# Altium schematic symbol library IC_ADI.SCHLIB: 3169 symbols (part 48 of 181)
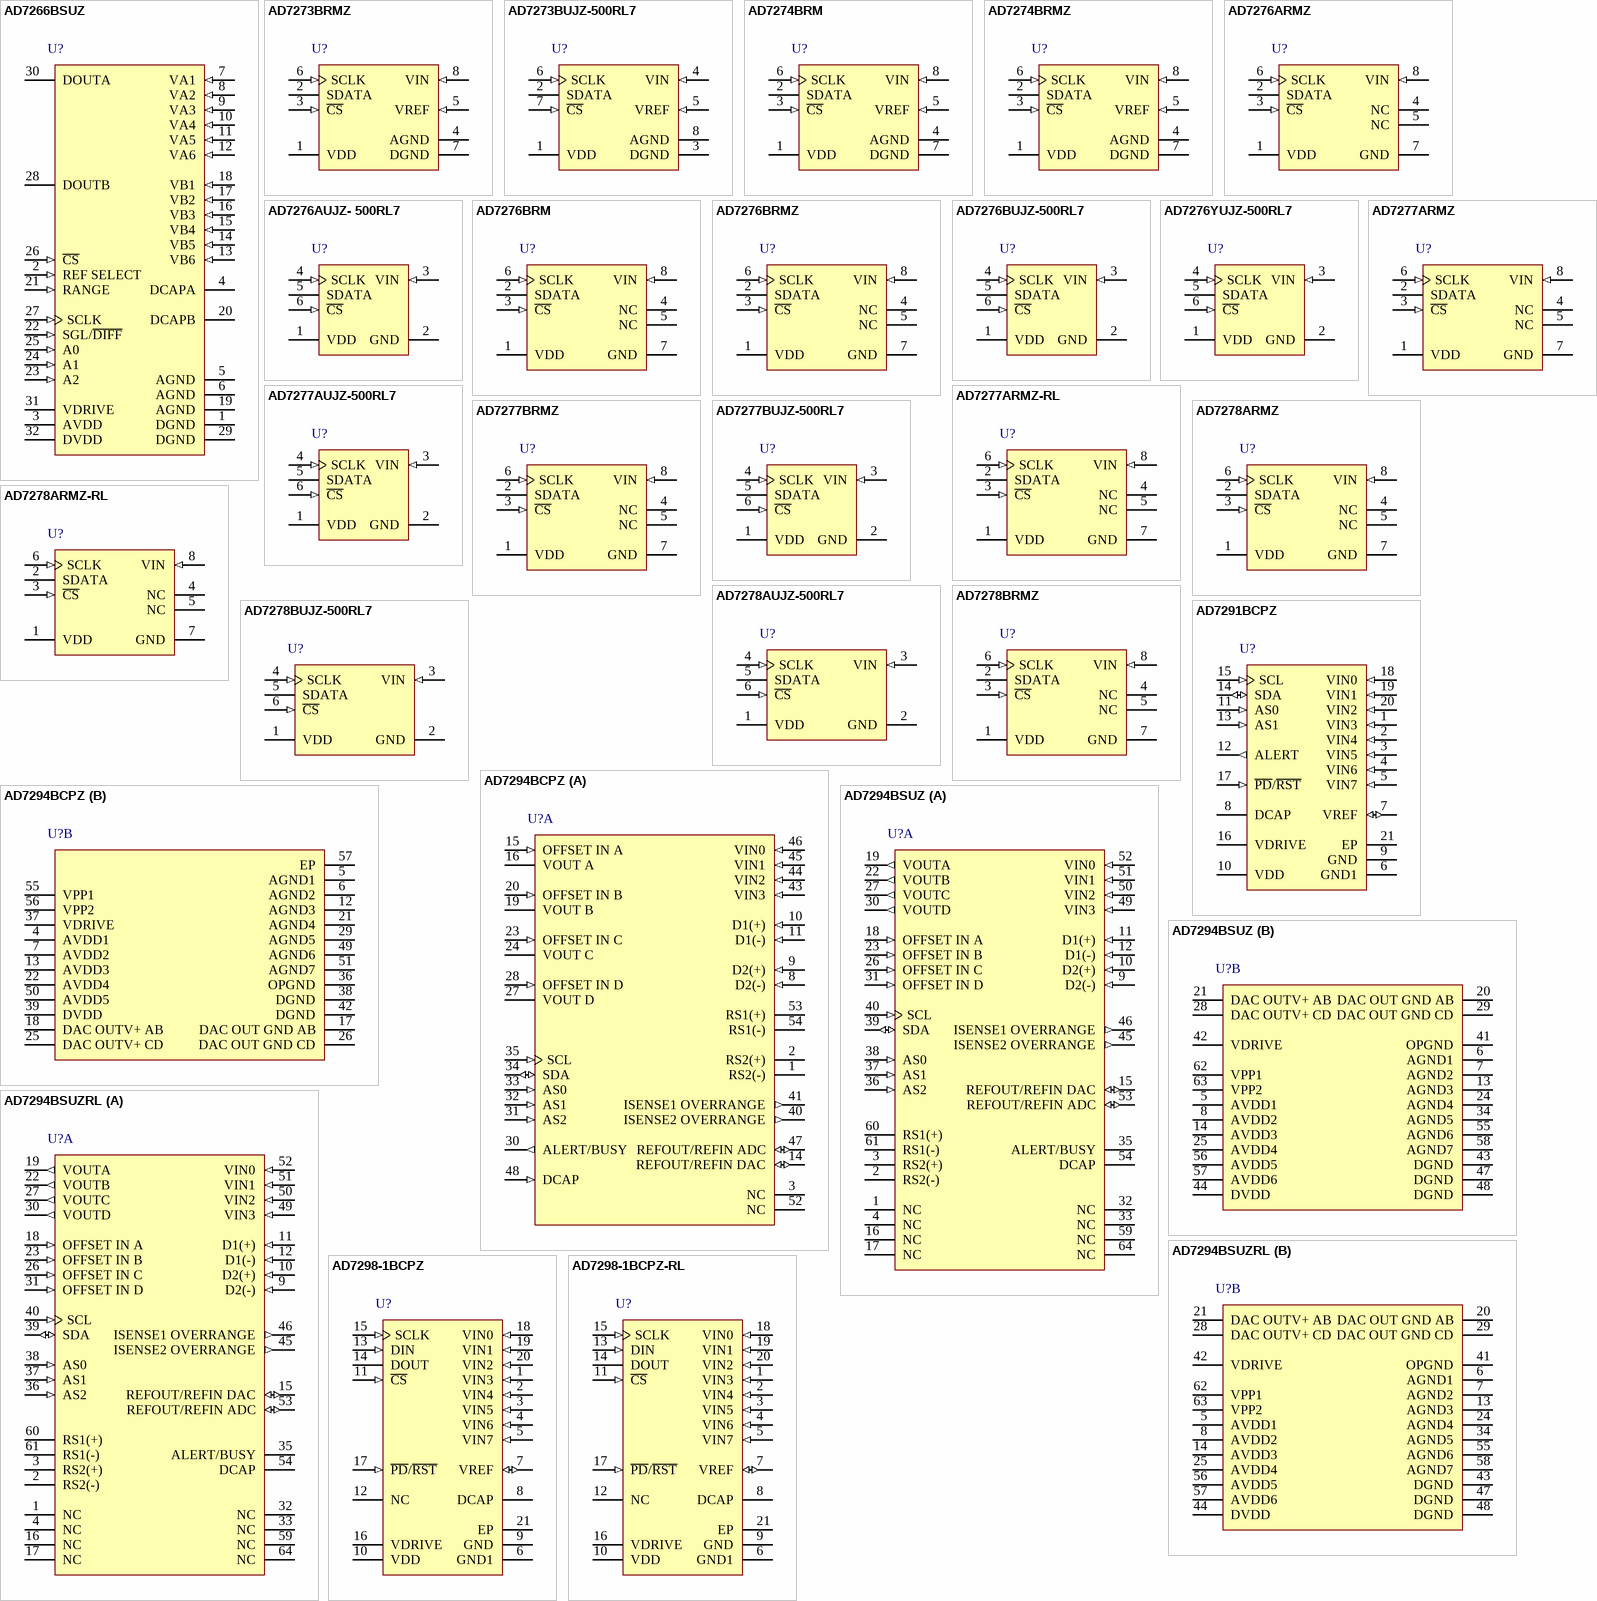
[diagram p238: symbols AD7266BSUZ to AD7298-1BCPZ-RL]

## AD7294BCPZ
designator U?
12-Bit Monitor and Control System with Multichannel ADC, DAC, Temperature Sensor, and Current Sense, 200KSPS, -40 to +105 degC, CP-56-1, Pb-Free, Tray; Generic Part Number: AD7294; PartNumber: AD7294BCPZ; Resolution (Bits): 12; Channels: 9; Throughput Rate (SPS): 200K; Interface: I2C/Ser 2-Wire, Ser; DatasheetVersion: Rev.H; PackageVersion: 112805-0; PackageReference: CP-56-1; PackageDescription: 56-Lead Lead Frame Chip Scale Package [LFCSP_VQ], 8 x 8 mm Body, Very Thin Quad; Supplier Part Number 1: AD7294BCPZ-ND; Supplier Part Number 2: 584-AD7294BCPZ; RoHS: Y; Packing: Tray; Mounting Technology: Surface Mount; Code_JEDEC: MO-220-VLLD-2; ComponentLink1Description: Manufacturer URL; ComponentLink2Description: Datasheet; ComponentLink3Description: Package Specification; ComponentLink4Description: Product URL
footprint QFN56_0.5-PAD(8X8) (Footprint not found)
part A pins: 1 RS2(-) "Connection for External Shunt Resistor", 2 RS2(+) "Connection for External Shunt Resistor", 3 NC "No Connection. Do not connect these pins.", 8 D2(-) (in) "Temperature Sensor Analog Input. These pins are connected to the external temperature sensing transistor. See Figure 46 and Figure 47.", 9 D2(+) (in) "Temperature Sensor Analog Input. These pins are connected to the external temperature sensing transistor. See Figure 46 and Figure 47.", 10 D1(+) (in) "Temperature Sensor Analog Input. These pins are connected to the external temperature sensing transistor. See Figure 46 and Figure 47.", 11 D1(-) (in) "Temperature Sensor Analog Input. These pins are connected to the external temperature sensing transistor. See Figure 46 and Figure 47.", 14 REFOUT/REFIN DAC (io) "DAC Reference Output/Input Pin. The REFOUT/REFIN DAC pin is common to all four DAC channels. On power-up, the default configuration of this pin is external reference (REFIN). Enable the internal reference by writing to the (See Datasheet)", 15 OFFSET IN A (in) "DAC Analog Offset Input Pins. These pins set the desired output range for each DAC channel. The DACs have an output voltage span of 5 V, which can be shifted from 0 V to 5 V to a maximum output voltage of 10 V to 15 V by (See Datasheet)", 16 VOUT A (hiz) "Buffered Analog DAC Outputs for Channel A to Channel D. Each DAC analog output is driven from an output amplifier that can be offset using the OFFSET IN x pin. The DAC has a maximum output voltage span of 5 V that can be (See Datasheet)", 19 VOUT B (hiz) "Buffered Analog DAC Outputs for Channel A to Channel D. Each DAC analog output is driven from an output amplifier that can be offset using the OFFSET IN x pin. The DAC has a maximum output voltage span of 5 V that can be (See Datasheet)", 20 OFFSET IN B (in) "DAC Analog Offset Input Pins. These pins set the desired output range for each DAC channel. The DACs have an output voltage span of 5 V, which can be shifted from 0 V to 5 V to a maximum output voltage of 10 V to 15 V by (See Datasheet)", 23 OFFSET IN C (in) "DAC Analog Offset Input Pins. These pins set the desired output range for each DAC channel. The DACs have an output voltage span of 5 V, which can be shifted from 0 V to 5 V to a maximum output voltage of 10 V to 15 V by (See Datasheet)", 24 VOUT C (hiz) "Buffered Analog DAC Outputs for Channel A to Channel D. Each DAC analog output is driven from an output amplifier that can be offset using the OFFSET IN x pin. The DAC has a maximum output voltage span of 5 V that can be (See Datasheet)", 27 VOUT D (hiz) "Buffered Analog DAC Outputs for Channel A to Channel D. Each DAC analog output is driven from an output amplifier that can be offset using the OFFSET IN x pin. The DAC has a maximum output voltage span of 5 V that can be (See Datasheet)", 28 OFFSET IN D (in) "DAC Analog Offset Input Pins. These pins set the desired output range for each DAC channel. The DACs have an output voltage span of 5 V, which can be shifted from 0 V to 5 V to a maximum output voltage of 10 V to 15 V by (See Datasheet)", 30 ALERT/BUSY (out) "Digital Output. Selectable as an alert or busy output function in the configuration register. This is an open-drain output. An external pull-up resistor is required.When configured as an alert, this pin acts as an (See Datasheet)", 31 AS2 (in) "Digital Logic Input. Together, the logic state of these inputs selects a unique I2C address for the AD7294. See Table 34 for details.", 32 AS1 (in) "Digital Logic Input. Together, the logic state of these inputs selects a unique I2C address for the AD7294. See Table 34 for details.", 33 AS0 (in) "Digital Logic Input. Together, the logic state of these inputs selects a unique I2C address for the AD7294. See Table 34 for details.", 34 SDA (io) "Digital Input/Output. Serial bus bidirectional data; external pull-up resistor required.", 35 SCL (in) "Serial I2C Bus Clock. The data transfer rate in I2C mode is compatible with both 100 kHz and 400 kHz operating modes. Open-drain input; external pull-up resistor required.", 40 ISENSE2 OVERRANGE (out) "Fault Comparator Outputs. These pins connect to the high-side current sense amplifiers.", 41 ISENSE1 OVERRANGE (out) "Fault Comparator Outputs. These pins connect to the high-side current sense amplifiers.", 43 VIN3 (in) "Uncommitted ADC Analog Inputs. These pins are programmable as four single-ended channels or two true differential analog input channel pairs.", 44 VIN2 (in) "Uncommitted ADC Analog Inputs. These pins are programmable as four single-ended channels or two true differential analog input channel pairs.", 45 VIN1 (in) "Uncommitted ADC Analog Inputs. These pins are programmable as four single-ended channels or two true differential analog input channel pairs.", 46 VIN0 (in) "Uncommitted ADC Analog Inputs. These pins are programmable as four single-ended channels or two true differential analog input channel pairs.", 47 REFOUT/REFIN ADC (io) "ADC Reference Input/Output Pin. The REFOUT/REFIN ADC pin provides the reference source for the ADC. Upon power-up, the default configuration of this pin is external reference (REFIN). Enable the internal reference by writing (See Datasheet)", 48 DCAP (in) "External Decoupling Capacitor Input for Internal Temperature Sensor. Decouple this pin to AGND using a 0.1 uF capacitor. In normal operation, the voltage is typically 3.7 V.", 52 NC "No Connection. Do not connect these pins.", 53 RS1(+) "Connection for External Shunt Resistor", 54 RS1(-) "Connection for External Shunt Resistor"
part B pins: 4 AVDD1 (power) "Analog Supply Pins. The operating range is 4.5 V to 5.5 V. These pins provide the supply voltage for all the analog circuitry on the AD7294. Connect the AVDD and DVDD pins together to ensure that all supply pins are at the (See Datasheet)", 5 AGND1 (power) "Analog Ground. Ground reference point for all analog circuitry on the AD7294. Refer all analog input signals and any external reference signal to this AGND voltage. Connect all seven of these AGND pins to the AGND plane of (See Datasheet)", 6 AGND2 (power) "Analog Ground. Ground reference point for all analog circuitry on the AD7294. Refer all analog input signals and any external reference signal to this AGND voltage. Connect all seven of these AGND pins to the AGND plane of (See Datasheet)", 7 AVDD2 (power) "Analog Supply Pins. The operating range is 4.5 V to 5.5 V. These pins provide the supply voltage for all the analog circuitry on the AD7294. Connect the AVDD and DVDD pins together to ensure that all supply pins are at the (See Datasheet)", 12 AGND3 (power) "Analog Ground. Ground reference point for all analog circuitry on the AD7294. Refer all analog input signals and any external reference signal to this AGND voltage. Connect all seven of these AGND pins to the AGND plane of (See Datasheet)", 13 AVDD3 (power) "Analog Supply Pins. The operating range is 4.5 V to 5.5 V. These pins provide the supply voltage for all the analog circuitry on the AD7294. Connect the AVDD and DVDD pins together to ensure that all supply pins are at the (See Datasheet)", 17 DAC OUT GND AB (power) "Analog Ground. Analog ground pins for the DAC output amplifiers on VOUTA and VOUTB, and VOUTC and VOUTD, respectively.", 18 DAC OUTV+ AB (power) "Analog Supply. Analog supply pins for the DAC output amplifiers on VOUTA and VOUTB, and VOUTC and VOUTD, respectively. The operating range is 4.5 V to 16.5 V.", 21 AGND4 (power) "Analog Ground. Ground reference point for all analog circuitry on the AD7294. Refer all analog input signals and any external reference signal to this AGND voltage. Connect all seven of these AGND pins to the AGND plane of (See Datasheet)", 22 AVDD4 (power) "Analog Supply Pins. The operating range is 4.5 V to 5.5 V. These pins provide the supply voltage for all the analog circuitry on the AD7294. Connect the AVDD and DVDD pins together to ensure that all supply pins are at the (See Datasheet)", 25 DAC OUTV+ CD (power) "Analog Supply. Analog supply pins for the DAC output amplifiers on VOUTA and VOUTB, and VOUTC and VOUTD, respectively. The operating range is 4.5 V to 16.5 V.", 26 DAC OUT GND CD (power) "Analog Ground. Analog ground pins for the DAC output amplifiers on VOUTA and VOUTB, and VOUTC and VOUTD, respectively.", 29 AGND5 (power) "Analog Ground. Ground reference point for all analog circuitry on the AD7294. Refer all analog input signals and any external reference signal to this AGND voltage. Connect all seven of these AGND pins to the AGND plane of (See Datasheet)", 36 OPGND (power) "Dedicated Ground Pin for I2C Interface.", 37 VDRIVE (power) "Logic Power Supply. The voltage supplied at this pin determines at what voltage the interface operates. Decouple this pin to DGND. The voltage range on this pin is 2.7 V to 5.5 V and may be different to the voltage level at (See Datasheet)", 38 DGND (power) "Digital Ground. This pin is the ground for all digital circuitry.", 39 DVDD (power) "Logic Power Supply. The operating range is 4.5 V to 5.5 V. These pins provide the supply voltage for all the digital circuitry on the AD7294. Connect the AVDD and DVDD pins together to ensure that all supply pins are at the (See Datasheet)", 42 DGND (power) "Digital Ground. This pin is the ground for all digital circuitry.", 49 AGND6 (power) "Analog Ground. Ground reference point for all analog circuitry on the AD7294. Refer all analog input signals and any external reference signal to this AGND voltage. Connect all seven of these AGND pins to the AGND plane of (See Datasheet)", 50 AVDD5 (power) "Analog Supply Pins. The operating range is 4.5 V to 5.5 V. These pins provide the supply voltage for all the analog circuitry on the AD7294. Connect the AVDD and DVDD pins together to ensure that all supply pins are at the (See Datasheet)", 51 AGND7 (power) "Analog Ground. Ground reference point for all analog circuitry on the AD7294. Refer all analog input signals and any external reference signal to this AGND voltage. Connect all seven of these AGND pins to the AGND plane of (See Datasheet)", 55 VPP1 (power) "Current Sensor Supply Pins. Power supply pins for the high-side current sense amplifiers. Operating range is from AVDD to 59.4 V. Decouple this supply to AGND.", 56 VPP2 (power) "Current Sensor Supply Pins. Power supply pins for the high-side current sense amplifiers. Operating range is from AVDD to 59.4 V. Decouple this supply to AGND.", 57 EP (power) "The exposed pad is located on the underside of the package. Connect the exposed pad to the ground plane of the PCB using multiple vias."

## AD7294BSUZ
designator U?
12-Bit Monitor and Control System with Multichannel ADC, DAC, Temperature Sensor, and Current Sense, 200KSPS, -40 to +105 degC, SU-64-1, Pb-Free, Tray; Generic Part Number: AD7294; PartNumber: AD7294BSUZ; Resolution (Bits): 12; Channels: 9; Throughput Rate (SPS): 200K; Interface: I2C/Ser 2-Wire, Ser; DatasheetVersion: Rev.H; PackageVersion: 032206-A; PackageReference: SU-64-1; PackageDescription: 64-Lead Thin Plastic Quad Flat Package [TQFP]; Supplier Part Number 1: AD7294BSUZ-ND; Supplier Part Number 2: 1607230; Supplier Part Number 3: 84M7804; Supplier Part Number 4: 584-AD7294BSUZ; RoHS: Y; Packing: Tray; Mounting Technology: Surface Mount; Code_JEDEC: MS-026-ABD; ComponentLink1Description: Manufacturer URL; ComponentLink2Description: Datasheet; ComponentLink3Description: Package Specification; ComponentLink4Description: Product URL
footprint LQFP64_0.4MM(10X10) (Footprint not found)
part A pins: 1 NC "No Connection. Do not connect these pins", 2 RS2(-) "Connection for External Shunt Resistor", 3 RS2(+) "Connection for External Shunt Resistor", 4 NC "No Connection. Do not connect these pins", 9 D2(-) (in) "Temperature Sensor Analog Input. These pins are connected to the external temperature sensing transistor. See Figure 46 and Figure 47", 10 D2(+) (in) "Temperature Sensor Analog Input. These pins are connected to the external temperature sensing transistor. See Figure 46 and Figure 47", 11 D1(+) (in) "Temperature Sensor Analog Input. These pins are connected to the external temperature sensing transistor. See Figure 46 and Figure 47", 12 D1(-) (in) "Temperature Sensor Analog Input. These pins are connected to the external temperature sensing transistor. See Figure 46 and Figure 47", 15 REFOUT/REFIN DAC (io) "DAC Reference Output/Input Pin. The REFOUT/REFIN DAC pin is common to all four DAC channels. On power-up, the default configuration of this pin is external reference (REFIN). Enable the internal reference by writing to the (See Datasheet)", 16 NC "No Connection. Do not connect these pins", 17 NC "No Connection. Do not connect these pins", 18 OFFSET IN A (in) "DAC Analog Offset Input Pins. These pins set the desired output range for each DAC channel. The DACs have an output voltage span of 5 V, which can be shifted from 0 V to 5 V to a maximum output voltage of 10 V to 15 V by (See Datasheet)", 19 VOUTA (out) "Buffered Analog DAC Outputs for Channel A to Channel D. Each DAC analog output is driven from an output amplifier that can be offset using the OFFSET IN x pin. The DAC has a maximum output voltage span of 5 V that can be (See Datasheet)", 22 VOUTB (out) "Buffered Analog DAC Outputs for Channel A to Channel D. Each DAC analog output is driven from an output amplifier that can be offset using the OFFSET IN x pin. The DAC has a maximum output voltage span of 5 V that can be (See Datasheet)", 23 OFFSET IN B (in) "DAC Analog Offset Input Pins. These pins set the desired output range for each DAC channel. The DACs have an output voltage span of 5 V, which can be shifted from 0 V to 5 V to a maximum output voltage of 10 V to 15 V by (See Datasheet)", 26 OFFSET IN C (in) "DAC Analog Offset Input Pins. These pins set the desired output range for each DAC channel. The DACs have an output voltage span of 5 V, which can be shifted from 0 V to 5 V to a maximum output voltage of 10 V to 15 V by (See Datasheet)", 27 VOUTC (out) "Buffered Analog DAC Outputs for Channel A to Channel D. Each DAC analog output is driven from an output amplifier that can be offset using the OFFSET IN x pin. The DAC has a maximum output voltage span of 5 V that can be (See Datasheet)", 30 VOUTD (out) "Buffered Analog DAC Outputs for Channel A to Channel D. Each DAC analog output is driven from an output amplifier that can be offset using the OFFSET IN x pin. The DAC has a maximum output voltage span of 5 V that can be (See Datasheet)", 31 OFFSET IN D (in) "DAC Analog Offset Input Pins. These pins set the desired output range for each DAC channel. The DACs have an output voltage span of 5 V, which can be shifted from 0 V to 5 V to a maximum output voltage of 10 V to 15 V by (See Datasheet)", 32 NC "No Connection. Do not connect these pins", 33 NC "No Connection. Do not connect these pins", 35 ALERT/BUSY (oc) "Digital Output. Selectable as an alert or busy output function in the configuration register. This is an open-drain output. An external pull-up resistor is required.When configured as an alert, this pin acts as an (See Datasheet)", 36 AS2 (in) "Digital Logic Input. Together, the logic state of these inputs selects a unique I2C address for the AD7294. See Table 34 for details.", 37 AS1 (in) "Digital Logic Input. Together, the logic state of these inputs selects a unique I2C address for the AD7294. See Table 34 for details.", 38 AS0 (in) "Digital Logic Input. Together, the logic state of these inputs selects a unique I2C address for the AD7294. See Table 34 for details.", 39 SDA (io) "Digital Input/Output. Serial bus bidirectional data; external pull-up resistor required.", 40 SCL (in) "Serial I2C Bus Clock. The data transfer rate in I2C mode is compatible with both 100 kHz and 400 kHz operating modes. Open-drain input; external pull-up resistor required.", 45 ISENSE2 OVERRANGE (out) "Fault Comparator Outputs. These pins connect to the high-side current sense amplifiers", 46 ISENSE1 OVERRANGE (out) "Fault Comparator Outputs. These pins connect to the high-side current sense amplifiers", 49 VIN3 (in) "Uncommitted ADC Analog Inputs. These pins are programmable as four single-ended channels or two true differential analog input channel pairs. See Table 1 and Table 13 for more details", 50 VIN2 (in) "Uncommitted ADC Analog Inputs. These pins are programmable as four single-ended channels or two true differential analog input channel pairs. See Table 1 and Table 13 for more details", 51 VIN1 (in) "Uncommitted ADC Analog Inputs. These pins are programmable as four single-ended channels or two true differential analog input channel pairs. See Table 1 and Table 13 for more details", 52 VIN0 (in) "Uncommitted ADC Analog Inputs. These pins are programmable as four single-ended channels or two true differential analog input channel pairs. See Table 1 and Table 13 for more details", 53 REFOUT/REFIN ADC (io) "ADC Reference Input/Output Pin. The REFOUT/REFIN ADC pin provides the reference source for the ADC. Upon power-up, the default configuration of this pin is external reference (REFIN). Enable the internal reference by writing (See Datasheet)", 54 DCAP "External Decoupling Capacitor Input for Internal Temperature Sensor. Decouple this pin to AGND using a 0.1 uF capacitor. In normal operation, the voltage is typically 3.7 V", 59 NC "No Connection. Do not connect these pins", 60 RS1(+) "Connection for External Shunt Resistor", 61 RS1(-) "Connection for External Shunt Resistor", 64 NC "No Connection. Do not connect these pins"
part B pins: 5 AVDD1 (power) "Analog Supply Pins. The operating range is 4.5 V to 5.5 V. These pins provide the supply voltage for all the analog circuitry on the AD7294. Connect the AVDD and DVDD pins together to ensure that all supply pins are at the (See Datasheet)", 6 AGND1 (power) "Analog Ground. Ground reference point for all analog circuitry on the AD7294. Refer all analog input signals and any external reference signal to this AGND voltage. Connect all seven of these AGND pins to the AGND plane of (See Datasheet)", 7 AGND2 (power) "Analog Ground. Ground reference point for all analog circuitry on the AD7294. Refer all analog input signals and any external reference signal to this AGND voltage. Connect all seven of these AGND pins to the AGND plane of (See Datasheet)", 8 AVDD2 (power) "Analog Supply Pins. The operating range is 4.5 V to 5.5 V. These pins provide the supply voltage for all the analog circuitry on the AD7294. Connect the AVDD and DVDD pins together to ensure that all supply pins are at the (See Datasheet)", 13 AGND3 (power) "Analog Ground. Ground reference point for all analog circuitry on the AD7294. Refer all analog input signals and any external reference signal to this AGND voltage. Connect all seven of these AGND pins to the AGND plane of (See Datasheet)", 14 AVDD3 (power) "Analog Supply Pins. The operating range is 4.5 V to 5.5 V. These pins provide the supply voltage for all the analog circuitry on the AD7294. Connect the AVDD and DVDD pins together to ensure that all supply pins are at the (See Datasheet)", 20 DAC OUT GND AB (power) "Analog Ground. Analog ground pins for the DAC output amplifiers on VOUTA and VOUTB, and VOUTC and VOUTD, respectively", 21 DAC OUTV+ AB (power) "Analog Supply. Analog supply pins for the DAC output amplifiers on VOUTA and VOUTB, and VOUTC and VOUTD, respectively. The operating range is 4.5 V to 16.5 V", 24 AGND4 (power) "Analog Ground. Ground reference point for all analog circuitry on the AD7294. Refer all analog input signals and any external reference signal to this AGND voltage. Connect all seven of these AGND pins to the AGND plane of (See Datasheet)", 25 AVDD4 (power) "Analog Supply Pins. The operating range is 4.5 V to 5.5 V. These pins provide the supply voltage for all the analog circuitry on the AD7294. Connect the AVDD and DVDD pins together to ensure that all supply pins are at the (See Datasheet)", 28 DAC OUTV+ CD (power) "Analog Supply. Analog supply pins for the DAC output amplifiers on VOUTA and VOUTB, and VOUTC and VOUTD, respectively. The operating range is 4.5 V to 16.5 V", 29 DAC OUT GND CD (power) "Analog Ground. Analog ground pins for the DAC output amplifiers on VOUTA and VOUTB, and VOUTC and VOUTD, respectively", 34 AGND5 (power) "Analog Ground. Ground reference point for all analog circuitry on the AD7294. Refer all analog input signals and any external reference signal to this AGND voltage. Connect all seven of these AGND pins to the AGND plane of (See Datasheet)", 41 OPGND (power) "Dedicated Ground Pin for I2C Interface", 42 VDRIVE (power) "Logic Power Supply. The voltage supplied at this pin determines at what voltage the interface operates. Decouple this pin to DGND. The voltage range on this pin is 2.7 V to 5.5 V and may be different to the voltage level at (See Datasheet)", 43 DGND (power) "Digital Ground. This pin is the ground for all digital circuitry", 44 DVDD (power) "Logic Power Supply. The operating range is 4.5 V to 5.5 V. These pins provide the supply voltage for all the digital circuitry on the AD7294. Connect the AVDD and DVDD pins together to ensure that all supply pins are at the (See Datasheet)", 47 DGND (power) "Digital Ground. This pin is the ground for all digital circuitry", 48 DGND (power) "Digital Ground. This pin is the ground for all digital circuitry", 55 AGND6 (power) "Analog Ground. Ground reference point for all analog circuitry on the AD7294. Refer all analog input signals and any external reference signal to this AGND voltage. Connect all seven of these AGND pins to the AGND plane of (See Datasheet)", 56 AVDD5 (power) "Analog Supply Pins. The operating range is 4.5 V to 5.5 V. These pins provide the supply voltage for all the analog circuitry on the AD7294. Connect the AVDD and DVDD pins together to ensure that all supply pins are at the (See Datasheet)", 57 AVDD6 (power) "Analog Supply Pins. The operating range is 4.5 V to 5.5 V. These pins provide the supply voltage for all the analog circuitry on the AD7294. Connect the AVDD and DVDD pins together to ensure that all supply pins are at the (See Datasheet)", 58 AGND7 (power) "Analog Ground. Ground reference point for all analog circuitry on the AD7294. Refer all analog input signals and any external reference signal to this AGND voltage. Connect all seven of these AGND pins to the AGND plane of (See Datasheet)", 62 VPP1 (power) "Current Sensor Supply Pins. Power supply pins for the high-side current sense amplifiers. Operating range is from AVDD to 59.4 V. Decouple this supply to AGND. See the Current Sense Filtering section", 63 VPP2 (power) "Current Sensor Supply Pins. Power supply pins for the high-side current sense amplifiers. Operating range is from AVDD to 59.4 V. Decouple this supply to AGND. See the Current Sense Filtering section"

## AD7294BSUZRL
designator U?
12-Bit Monitor and Control System with Multichannel ADC, DAC, Temperature Sensor, and Current Sense, 200KSPS, -40 to +105 degC, SU-64-1, Pb-Free, Reel; Generic Part Number: AD7294; PartNumber: AD7294BSUZRL; Resolution (Bits): 12; Channels: 9; Throughput Rate (SPS): 200K; Interface: I2C/Ser 2-Wire, Ser; DatasheetVersion: Rev.H; PackageVersion: 032206-A; PackageReference: SU-64-1; PackageDescription: 64-Lead Thin Plastic Quad Flat Package [TQFP]; Supplier Part Number 1: AD7294BSUZRL-ND; Supplier Part Number 2: 584-AD7294BSUZR; RoHS: Y; Packing: Reel; Mounting Technology: Surface Mount; Code_JEDEC: MS-026-ABD; ComponentLink1Description: Manufacturer URL; ComponentLink2Description: Datasheet; ComponentLink3Description: Package Specification; ComponentLink4Description: Product URL
footprint LQFP64_0.4MM(10X10) (Footprint not found)
part A pins: 1 NC "No Connection. Do not connect these pins", 2 RS2(-) "Connection for External Shunt Resistor", 3 RS2(+) "Connection for External Shunt Resistor", 4 NC "No Connection. Do not connect these pins", 9 D2(-) (in) "Temperature Sensor Analog Input. These pins are connected to the external temperature sensing transistor. See Figure 46 and Figure 47", 10 D2(+) (in) "Temperature Sensor Analog Input. These pins are connected to the external temperature sensing transistor. See Figure 46 and Figure 47", 11 D1(+) (in) "Temperature Sensor Analog Input. These pins are connected to the external temperature sensing transistor. See Figure 46 and Figure 47", 12 D1(-) (in) "Temperature Sensor Analog Input. These pins are connected to the external temperature sensing transistor. See Figure 46 and Figure 47", 15 REFOUT/REFIN DAC (io) "DAC Reference Output/Input Pin. The REFOUT/REFIN DAC pin is common to all four DAC channels. On power-up, the default configuration of this pin is external reference (REFIN). Enable the internal reference by writing to the (See Datasheet)", 16 NC "No Connection. Do not connect these pins", 17 NC "No Connection. Do not connect these pins", 18 OFFSET IN A (in) "DAC Analog Offset Input Pins. These pins set the desired output range for each DAC channel. The DACs have an output voltage span of 5 V, which can be shifted from 0 V to 5 V to a maximum output voltage of 10 V to 15 V by (See Datasheet)", 19 VOUTA (out) "Buffered Analog DAC Outputs for Channel A to Channel D. Each DAC analog output is driven from an output amplifier that can be offset using the OFFSET IN x pin. The DAC has a maximum output voltage span of 5 V that can be (See Datasheet)", 22 VOUTB (out) "Buffered Analog DAC Outputs for Channel A to Channel D. Each DAC analog output is driven from an output amplifier that can be offset using the OFFSET IN x pin. The DAC has a maximum output voltage span of 5 V that can be (See Datasheet)", 23 OFFSET IN B (in) "DAC Analog Offset Input Pins. These pins set the desired output range for each DAC channel. The DACs have an output voltage span of 5 V, which can be shifted from 0 V to 5 V to a maximum output voltage of 10 V to 15 V by (See Datasheet)", 26 OFFSET IN C (in) "DAC Analog Offset Input Pins. These pins set the desired output range for each DAC channel. The DACs have an output voltage span of 5 V, which can be shifted from 0 V to 5 V to a maximum output voltage of 10 V to 15 V by (See Datasheet)", 27 VOUTC (out) "Buffered Analog DAC Outputs for Channel A to Channel D. Each DAC analog output is driven from an output amplifier that can be offset using the OFFSET IN x pin. The DAC has a maximum output voltage span of 5 V that can be (See Datasheet)", 30 VOUTD (out) "Buffered Analog DAC Outputs for Channel A to Channel D. Each DAC analog output is driven from an output amplifier that can be offset using the OFFSET IN x pin. The DAC has a maximum output voltage span of 5 V that can be (See Datasheet)", 31 OFFSET IN D (in) "DAC Analog Offset Input Pins. These pins set the desired output range for each DAC channel. The DACs have an output voltage span of 5 V, which can be shifted from 0 V to 5 V to a maximum output voltage of 10 V to 15 V by (See Datasheet)", 32 NC "No Connection. Do not connect these pins", 33 NC "No Connection. Do not connect these pins", 35 ALERT/BUSY (oc) "Digital Output. Selectable as an alert or busy output function in the configuration register. This is an open-drain output. An external pull-up resistor is required.When configured as an alert, this pin acts as an (See Datasheet)", 36 AS2 (in) "Digital Logic Input. Together, the logic state of these inputs selects a unique I2C address for the AD7294. See Table 34 for details.", 37 AS1 (in) "Digital Logic Input. Together, the logic state of these inputs selects a unique I2C address for the AD7294. See Table 34 for details.", 38 AS0 (in) "Digital Logic Input. Together, the logic state of these inputs selects a unique I2C address for the AD7294. See Table 34 for details.", 39 SDA (io) "Digital Input/Output. Serial bus bidirectional data; external pull-up resistor required.", 40 SCL (in) "Serial I2C Bus Clock. The data transfer rate in I2C mode is compatible with both 100 kHz and 400 kHz operating modes. Open-drain input; external pull-up resistor required.", 45 ISENSE2 OVERRANGE (out) "Fault Comparator Outputs. These pins connect to the high-side current sense amplifiers", 46 ISENSE1 OVERRANGE (out) "Fault Comparator Outputs. These pins connect to the high-side current sense amplifiers", 49 VIN3 (in) "Uncommitted ADC Analog Inputs. These pins are programmable as four single-ended channels or two true differential analog input channel pairs. See Table 1 and Table 13 for more details", 50 VIN2 (in) "Uncommitted ADC Analog Inputs. These pins are programmable as four single-ended channels or two true differential analog input channel pairs. See Table 1 and Table 13 for more details", 51 VIN1 (in) "Uncommitted ADC Analog Inputs. These pins are programmable as four single-ended channels or two true differential analog input channel pairs. See Table 1 and Table 13 for more details", 52 VIN0 (in) "Uncommitted ADC Analog Inputs. These pins are programmable as four single-ended channels or two true differential analog input channel pairs. See Table 1 and Table 13 for more details", 53 REFOUT/REFIN ADC (io) "ADC Reference Input/Output Pin. The REFOUT/REFIN ADC pin provides the reference source for the ADC. Upon power-up, the default configuration of this pin is external reference (REFIN). Enable the internal reference by writing (See Datasheet)", 54 DCAP "External Decoupling Capacitor Input for Internal Temperature Sensor. Decouple this pin to AGND using a 0.1 uF capacitor. In normal operation, the voltage is typically 3.7 V", 59 NC "No Connection. Do not connect these pins", 60 RS1(+) "Connection for External Shunt Resistor", 61 RS1(-) "Connection for External Shunt Resistor", 64 NC "No Connection. Do not connect these pins"
part B pins: 5 AVDD1 (power) "Analog Supply Pins. The operating range is 4.5 V to 5.5 V. These pins provide the supply voltage for all the analog circuitry on the AD7294. Connect the AVDD and DVDD pins together to ensure that all supply pins are at the (See Datasheet)", 6 AGND1 (power) "Analog Ground. Ground reference point for all analog circuitry on the AD7294. Refer all analog input signals and any external reference signal to this AGND voltage. Connect all seven of these AGND pins to the AGND plane of (See Datasheet)", 7 AGND2 (power) "Analog Ground. Ground reference point for all analog circuitry on the AD7294. Refer all analog input signals and any external reference signal to this AGND voltage. Connect all seven of these AGND pins to the AGND plane of (See Datasheet)", 8 AVDD2 (power) "Analog Supply Pins. The operating range is 4.5 V to 5.5 V. These pins provide the supply voltage for all the analog circuitry on the AD7294. Connect the AVDD and DVDD pins together to ensure that all supply pins are at the (See Datasheet)", 13 AGND3 (power) "Analog Ground. Ground reference point for all analog circuitry on the AD7294. Refer all analog input signals and any external reference signal to this AGND voltage. Connect all seven of these AGND pins to the AGND plane of (See Datasheet)", 14 AVDD3 (power) "Analog Supply Pins. The operating range is 4.5 V to 5.5 V. These pins provide the supply voltage for all the analog circuitry on the AD7294. Connect the AVDD and DVDD pins together to ensure that all supply pins are at the (See Datasheet)", 20 DAC OUT GND AB (power) "Analog Ground. Analog ground pins for the DAC output amplifiers on VOUTA and VOUTB, and VOUTC and VOUTD, respectively", 21 DAC OUTV+ AB (power) "Analog Supply. Analog supply pins for the DAC output amplifiers on VOUTA and VOUTB, and VOUTC and VOUTD, respectively. The operating range is 4.5 V to 16.5 V", 24 AGND4 (power) "Analog Ground. Ground reference point for all analog circuitry on the AD7294. Refer all analog input signals and any external reference signal to this AGND voltage. Connect all seven of these AGND pins to the AGND plane of (See Datasheet)", 25 AVDD4 (power) "Analog Supply Pins. The operating range is 4.5 V to 5.5 V. These pins provide the supply voltage for all the analog circuitry on the AD7294. Connect the AVDD and DVDD pins together to ensure that all supply pins are at the (See Datasheet)", 28 DAC OUTV+ CD (power) "Analog Supply. Analog supply pins for the DAC output amplifiers on VOUTA and VOUTB, and VOUTC and VOUTD, respectively. The operating range is 4.5 V to 16.5 V", 29 DAC OUT GND CD (power) "Analog Ground. Analog ground pins for the DAC output amplifiers on VOUTA and VOUTB, and VOUTC and VOUTD, respectively", 34 AGND5 (power) "Analog Ground. Ground reference point for all analog circuitry on the AD7294. Refer all analog input signals and any external reference signal to this AGND voltage. Connect all seven of these AGND pins to the AGND plane of (See Datasheet)", 41 OPGND (power) "Dedicated Ground Pin for I2C Interface", 42 VDRIVE (power) "Logic Power Supply. The voltage supplied at this pin determines at what voltage the interface operates. Decouple this pin to DGND. The voltage range on this pin is 2.7 V to 5.5 V and may be different to the voltage level at (See Datasheet)", 43 DGND (power) "Digital Ground. This pin is the ground for all digital circuitry", 44 DVDD (power) "Logic Power Supply. The operating range is 4.5 V to 5.5 V. These pins provide the supply voltage for all the digital circuitry on the AD7294. Connect the AVDD and DVDD pins together to ensure that all supply pins are at the (See Datasheet)", 47 DGND (power) "Digital Ground. This pin is the ground for all digital circuitry", 48 DGND (power) "Digital Ground. This pin is the ground for all digital circuitry", 55 AGND6 (power) "Analog Ground. Ground reference point for all analog circuitry on the AD7294. Refer all analog input signals and any external reference signal to this AGND voltage. Connect all seven of these AGND pins to the AGND plane of (See Datasheet)", 56 AVDD5 (power) "Analog Supply Pins. The operating range is 4.5 V to 5.5 V. These pins provide the supply voltage for all the analog circuitry on the AD7294. Connect the AVDD and DVDD pins together to ensure that all supply pins are at the (See Datasheet)", 57 AVDD6 (power) "Analog Supply Pins. The operating range is 4.5 V to 5.5 V. These pins provide the supply voltage for all the analog circuitry on the AD7294. Connect the AVDD and DVDD pins together to ensure that all supply pins are at the (See Datasheet)", 58 AGND7 (power) "Analog Ground. Ground reference point for all analog circuitry on the AD7294. Refer all analog input signals and any external reference signal to this AGND voltage. Connect all seven of these AGND pins to the AGND plane of (See Datasheet)", 62 VPP1 (power) "Current Sensor Supply Pins. Power supply pins for the high-side current sense amplifiers. Operating range is from AVDD to 59.4 V. Decouple this supply to AGND. See the Current Sense Filtering section", 63 VPP2 (power) "Current Sensor Supply Pins. Power supply pins for the high-side current sense amplifiers. Operating range is from AVDD to 59.4 V. Decouple this supply to AGND. See the Current Sense Filtering section"

## AD7298-1BCPZ
designator U?
8 Channel 10-Bit SAR Analog-to-Digital Converter with SPI Interface, 1MSPS, -40 to +125 degC, CP-20-8, Pb-Free, Tray; Generic Part Number: AD7298-1; PartNumber: AD7298-1BCPZ; Resolution (Bits): 10; Channels: 8; Throughput Rate (SPS): 1M; DatasheetVersion: Rev.A; PackageVersion: 020509-B; PackageReference: CP-20-8; PackageDescription: 20-Lead Lead Frame Chip Scale Package [LFCSP_WQ] 4 x 4 mm Body, Very Very Thin Quad; Supplier Part Number 1: AD7298-1BCPZ-ND; Supplier Part Number 2: 1864665; Supplier Part Number 3: 27T5722; Supplier Part Number 4: 18T2145; Supplier Part Number 5: 584-AD7298-1BCPZ; Interface: SPI; RoHS: Y; Packing: Tray; Mounting Technology: Surface Mount; Code_JEDEC: MO-220-WGGD; ComponentLink1Description: Manufacturer URL; ComponentLink2Description: Datasheet; ComponentLink3Description: Package Specification; ComponentLink4Description: Product URL
footprint QFN20_0.5-PAD(4X4) (Footprint not found)
pins: 1 VIN3 (in) "Analog Inputs. The AD7298-1 has eight single-ended analog inputs that are multiplexed into the on-chip track-and-hold. Each input channel can accept analog inputs from 0 V to 2.5 V. Any unused input channels should be (See Datasheet)", 2 VIN4 (in) "Analog Inputs. The AD7298-1 has eight single-ended analog inputs that are multiplexed into the on-chip track-and-hold. Each input channel can accept analog inputs from 0 V to 2.5 V. Any unused input channels should be (See Datasheet)", 3 VIN5 (in) "Analog Inputs. The AD7298-1 has eight single-ended analog inputs that are multiplexed into the on-chip track-and-hold. Each input channel can accept analog inputs from 0 V to 2.5 V. Any unused input channels should be (See Datasheet)", 4 VIN6 (in) "Analog Inputs. The AD7298-1 has eight single-ended analog inputs that are multiplexed into the on-chip track-and-hold. Each input channel can accept analog inputs from 0 V to 2.5 V. Any unused input channels should be (See Datasheet)", 5 VIN7 (in) "Analog Inputs. The AD7298-1 has eight single-ended analog inputs that are multiplexed into the on-chip track-and-hold. Each input channel can accept analog inputs from 0 V to 2.5 V. Any unused input channels should be (See Datasheet)", 6 GND1 (power) "Ground. Ground reference point for the internal reference circuitry on the AD7298-1. The external reference signals and all analog input signals should be referred to the GND1 voltage. The GND1 pin should be connected to the (See Datasheet)", 7 VREF (io) "Internal Reference/External Reference Supply. The nominal internal reference voltage of 2.5 V appears at this pin.Provided the output is buffered, the on-chip reference can be taken from this pin and applied externally to (See Datasheet)", 8 DCAP "Decoupling Capacitor Pins. Decoupling capacitors (1 uF recommended) are connected to this pin to decouple the internal LDO.", 9 GND (power) "Ground. Ground reference point for all analog and digital circuitry on the AD7298-1. The GND pin should be connected to the ground plane of the system. All ground pins should ideally be at the same potential and must not be (See Datasheet)", 10 VDD (power) "Supply Voltage, 2.8 V to 3.6 V. This supply should be decoupled to GND with 10 uF and 100 nF decoupling capacitors.", 11 ~{CS} (in) "Chip Select, Active Low Logic Input. This pin is edge triggered on the falling edge of this input, the track-and-hold goes into hold mode, and a conversion is initiated. This input also frames the serial data transfer. When (See Datasheet)", 12 NC "No Connect.", 13 DIN (in) "Data In, Logic Input. Data to be written to the AD7298-1 control register is provided on this input and is clocked into the register on the falling edge of SCLK.", 14 DOUT (hiz) "Serial Data Output. The conversion result from the AD7298-1 is provided on this output as a serial data stream.The bits are clocked out on the falling edge of the SCLK input. The data stream from the AD7298-1 consists of (See Datasheet)", 15 SCLK (in) "Serial Clock, Logic Input. A serial clock input provides the SCLK for accessing the data from the AD7298-1.", 16 VDRIVE (power) "Logic Power Supply Input. The voltage supplied at this pin determines the voltage at which the interface operates. This pin should be decoupled to ground. The voltage range on this pin is 1.65 V to 3.6 V and may be less than (See Datasheet)", 17 ~{PD}/~{RST} (in) "Power-Down Pin. This pin places the part into full power-down mode and enables power conservation when operation is not required. This pin can be used to reset the device by toggling the pin low for a minimum of 1 ns and a (See Datasheet)", 18 VIN0 (in) "Analog Inputs. The AD7298-1 has eight single-ended analog inputs that are multiplexed into the on-chip track-and-hold. Each input channel can accept analog inputs from 0 V to 2.5 V. Any unused input channels should be (See Datasheet)", 19 VIN1 (in) "Analog Inputs. The AD7298-1 has eight single-ended analog inputs that are multiplexed into the on-chip track-and-hold. Each input channel can accept analog inputs from 0 V to 2.5 V. Any unused input channels should be (See Datasheet)", 20 VIN2 (in) "Analog Inputs. The AD7298-1 has eight single-ended analog inputs that are multiplexed into the on-chip track-and-hold. Each input channel can accept analog inputs from 0 V to 2.5 V. Any unused input channels should be (See Datasheet)", 21 EP (power) "The exposed metal paddle on the bottom of the LFCSP package should be soldered to PCB ground for proper functionality and heat dissipation."

## AD7298-1BCPZ-RL
designator U?
8 Channel 10-Bit SAR Analog-to-Digital Converter with SPI Interface, 1MSPS, -40 to +125 degC, CP-20-8, Pb-Free, Reel; Generic Part Number: AD7298-1; PartNumber: AD7298-1BCPZ-RL; Resolution (Bits): 10; Channels: 8; Throughput Rate (SPS): 1M; DatasheetVersion: Rev.A; PackageVersion: 020509-B; PackageReference: CP-20-8; PackageDescription: 20-Lead Lead Frame Chip Scale Package [LFCSP_WQ] 4 x 4 mm Body, Very Very Thin Quad; Supplier Part Number 1: AD7298-1BCPZ-RLTR-ND; Supplier Part Number 2: AD7298-1BCPZ-RLCT-ND; Supplier Part Number 3: AD7298-1BCPZ-RLDKR-ND; Supplier Part Number 4: 584-AD7298-1BCPZ-R; Interface: SPI; RoHS: Y; Packing: Reel; Mounting Technology: Surface Mount; Code_JEDEC: MO-220-WGGD; ComponentLink1Description: Manufacturer URL; ComponentLink2Description: Datasheet; ComponentLink3Description: Package Specification; ComponentLink4Description: Product URL
footprint QFN20_0.5-PAD(4X4) (Footprint not found)
pins: 1 VIN3 (in) "Analog Inputs. The AD7298-1 has eight single-ended analog inputs that are multiplexed into the on-chip track-and-hold. Each input channel can accept analog inputs from 0 V to 2.5 V. Any unused input channels should be (See Datasheet)", 2 VIN4 (in) "Analog Inputs. The AD7298-1 has eight single-ended analog inputs that are multiplexed into the on-chip track-and-hold. Each input channel can accept analog inputs from 0 V to 2.5 V. Any unused input channels should be (See Datasheet)", 3 VIN5 (in) "Analog Inputs. The AD7298-1 has eight single-ended analog inputs that are multiplexed into the on-chip track-and-hold. Each input channel can accept analog inputs from 0 V to 2.5 V. Any unused input channels should be (See Datasheet)", 4 VIN6 (in) "Analog Inputs. The AD7298-1 has eight single-ended analog inputs that are multiplexed into the on-chip track-and-hold. Each input channel can accept analog inputs from 0 V to 2.5 V. Any unused input channels should be (See Datasheet)", 5 VIN7 (in) "Analog Inputs. The AD7298-1 has eight single-ended analog inputs that are multiplexed into the on-chip track-and-hold. Each input channel can accept analog inputs from 0 V to 2.5 V. Any unused input channels should be (See Datasheet)", 6 GND1 (power) "Ground. Ground reference point for the internal reference circuitry on the AD7298-1. The external reference signals and all analog input signals should be referred to the GND1 voltage. The GND1 pin should be connected to the (See Datasheet)", 7 VREF (io) "Internal Reference/External Reference Supply. The nominal internal reference voltage of 2.5 V appears at this pin.Provided the output is buffered, the on-chip reference can be taken from this pin and applied externally to (See Datasheet)", 8 DCAP "Decoupling Capacitor Pins. Decoupling capacitors (1 uF recommended) are connected to this pin to decouple the internal LDO.", 9 GND (power) "Ground. Ground reference point for all analog and digital circuitry on the AD7298-1. The GND pin should be connected to the ground plane of the system. All ground pins should ideally be at the same potential and must not be (See Datasheet)", 10 VDD (power) "Supply Voltage, 2.8 V to 3.6 V. This supply should be decoupled to GND with 10 uF and 100 nF decoupling capacitors.", 11 ~{CS} (in) "Chip Select, Active Low Logic Input. This pin is edge triggered on the falling edge of this input, the track-and-hold goes into hold mode, and a conversion is initiated. This input also frames the serial data transfer. When (See Datasheet)", 12 NC "No Connect.", 13 DIN (in) "Data In, Logic Input. Data to be written to the AD7298-1 control register is provided on this input and is clocked into the register on the falling edge of SCLK.", 14 DOUT (hiz) "Serial Data Output. The conversion result from the AD7298-1 is provided on this output as a serial data stream.The bits are clocked out on the falling edge of the SCLK input. The data stream from the AD7298-1 consists of (See Datasheet)", 15 SCLK (in) "Serial Clock, Logic Input. A serial clock input provides the SCLK for accessing the data from the AD7298-1.", 16 VDRIVE (power) "Logic Power Supply Input. The voltage supplied at this pin determines the voltage at which the interface operates. This pin should be decoupled to ground. The voltage range on this pin is 1.65 V to 3.6 V and may be less than (See Datasheet)", 17 ~{PD}/~{RST} (in) "Power-Down Pin. This pin places the part into full power-down mode and enables power conservation when operation is not required. This pin can be used to reset the device by toggling the pin low for a minimum of 1 ns and a (See Datasheet)", 18 VIN0 (in) "Analog Inputs. The AD7298-1 has eight single-ended analog inputs that are multiplexed into the on-chip track-and-hold. Each input channel can accept analog inputs from 0 V to 2.5 V. Any unused input channels should be (See Datasheet)", 19 VIN1 (in) "Analog Inputs. The AD7298-1 has eight single-ended analog inputs that are multiplexed into the on-chip track-and-hold. Each input channel can accept analog inputs from 0 V to 2.5 V. Any unused input channels should be (See Datasheet)", 20 VIN2 (in) "Analog Inputs. The AD7298-1 has eight single-ended analog inputs that are multiplexed into the on-chip track-and-hold. Each input channel can accept analog inputs from 0 V to 2.5 V. Any unused input channels should be (See Datasheet)", 21 EP (power) "The exposed metal paddle on the bottom of the LFCSP package should be soldered to PCB ground for proper functionality and heat dissipation."

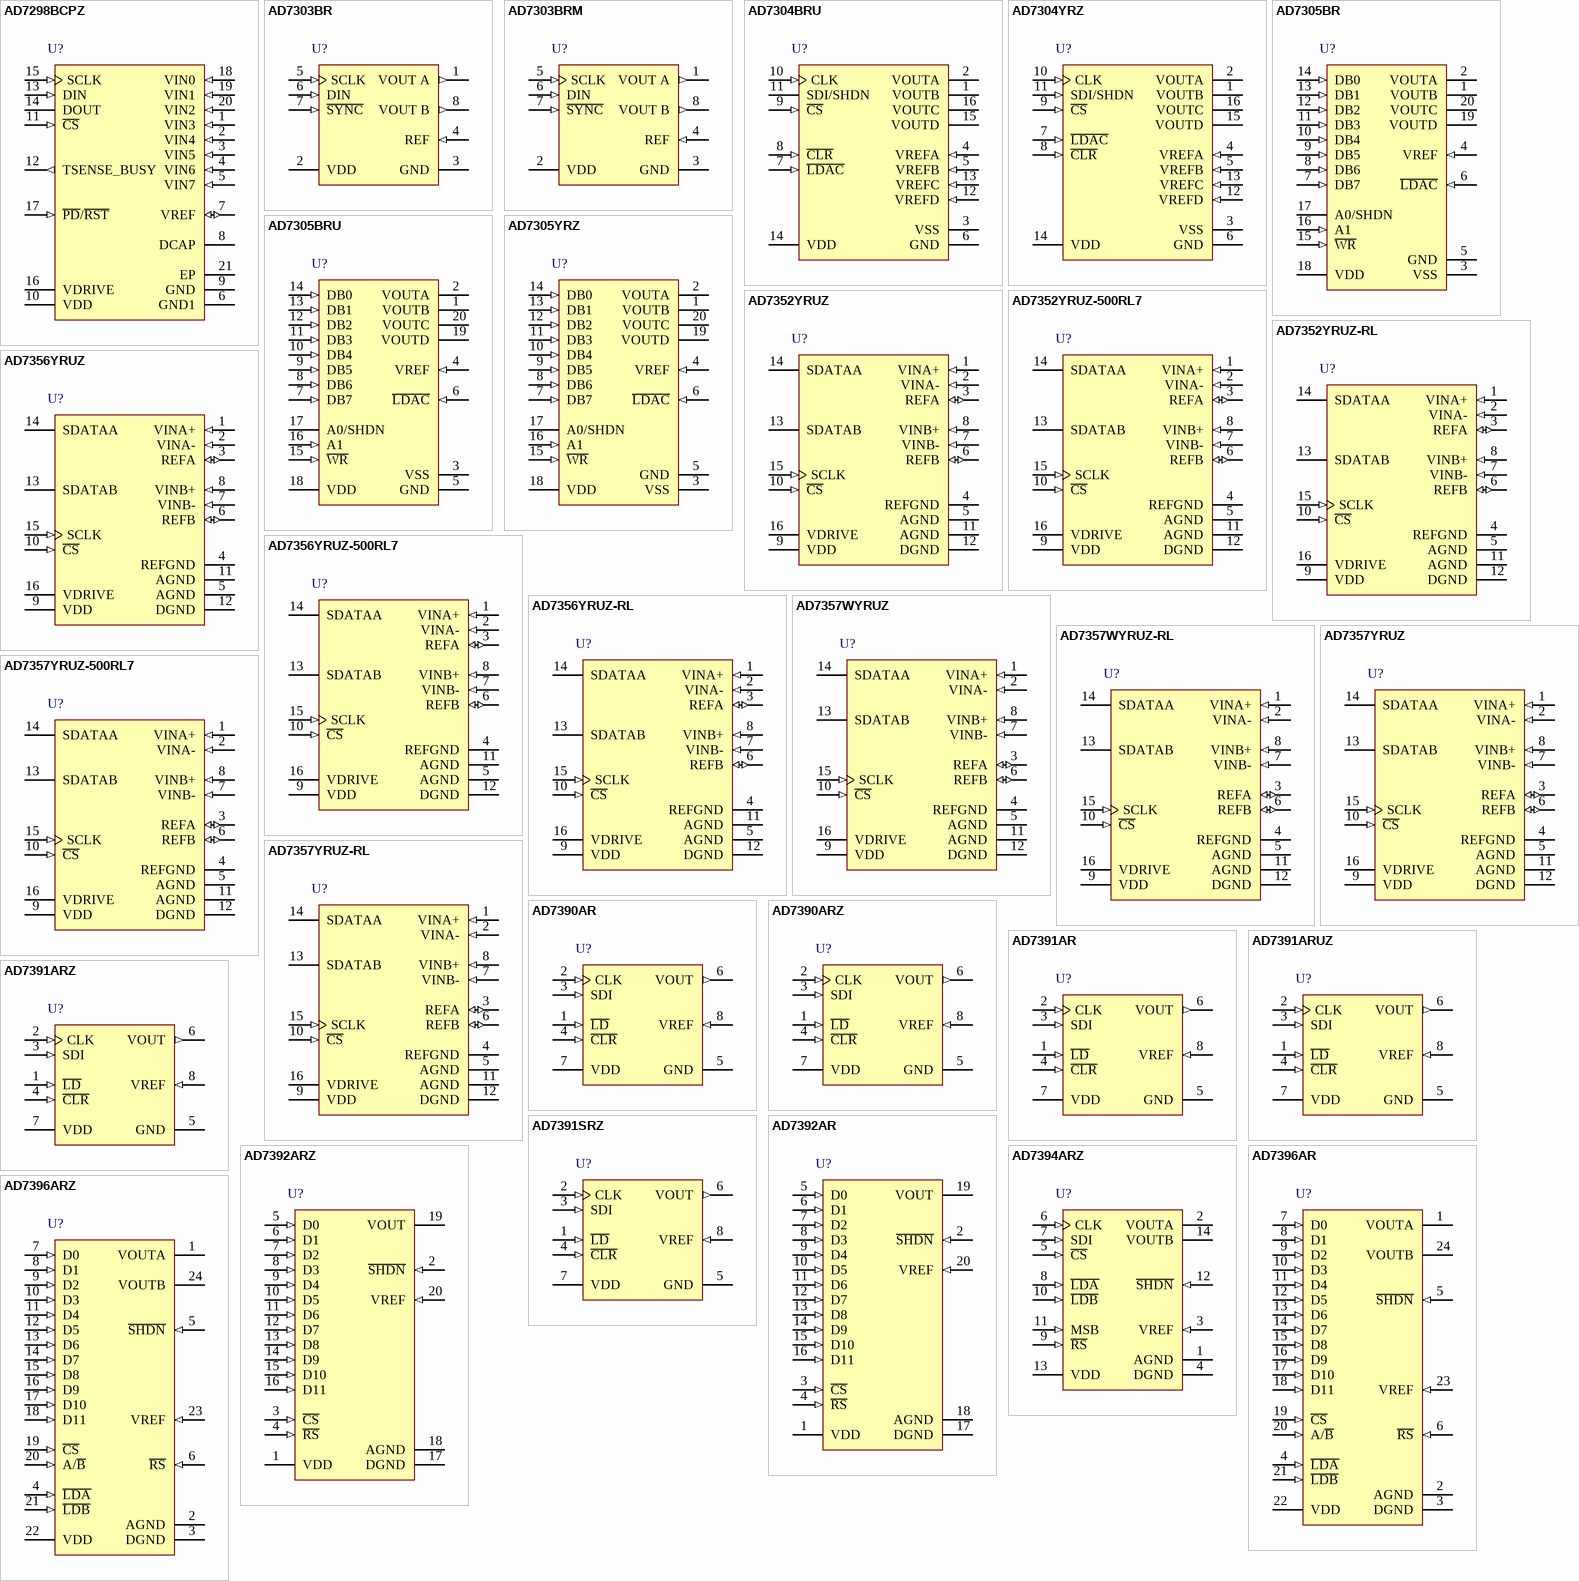
[diagram p42: symbols AD7298BCPZ to AD7396ARZ]

## AD7298BCPZ
designator U?
8 Channel 12-Bit SAR Analog-to-Digital Converter with SPI Interface and Temperature Sensor 1MSPS, -40 to +125 degC, CP-20-8, Pb-Free, Tray; Generic Part Number: AD7298; PartNumber: AD7298BCPZ; Resolution (Bits): 12; Channels: 9; Throughput Rate (SPS): 1M; DatasheetVersion: Rev.B; PackageVersion: 020509-B; PackageReference: CP-20-8; PackageDescription: 20-Lead Lead Frame Chip Scale Package [LFCSP_WQ] 4 x 4 mm Body, Very Very Thin Quad; Supplier Part Number 1: AD7298BCPZ-ND; Supplier Part Number 2: 1864666; Supplier Part Number 3: 27T5723; Supplier Part Number 4: 18T2147; Supplier Part Number 5: 584-AD7298BCPZ; Interface: SPI; RoHS: Y; Packing: Tray; Mounting Technology: Surface Mount; Code_JEDEC: MO-220-WGGD; ComponentLink1Description: Manufacturer URL; ComponentLink2Description: Datasheet; ComponentLink3Description: Package Specification; ComponentLink4Description: Product URL
footprint QFN20_0.5-PAD(4X4) (Footprint not found)
pins: 1 VIN3 (in) "Analog Inputs. The AD7298 has eight single-ended analog inputs that are multiplexed into the on-chip track-and-hold. Each input channel can accept analog inputs from 0 V to 2.5 V. Any unused input channels should be (See Datasheet)", 2 VIN4 (in) "Analog Inputs. The AD7298 has eight single-ended analog inputs that are multiplexed into the on-chip track-and-hold. Each input channel can accept analog inputs from 0 V to 2.5 V. Any unused input channels should be (See Datasheet)", 3 VIN5 (in) "Analog Inputs. The AD7298 has eight single-ended analog inputs that are multiplexed into the on-chip track-and-hold. Each input channel can accept analog inputs from 0 V to 2.5 V. Any unused input channels should be (See Datasheet)", 4 VIN6 (in) "Analog Inputs. The AD7298 has eight single-ended analog inputs that are multiplexed into the on-chip track-and-hold. Each input channel can accept analog inputs from 0 V to 2.5 V. Any unused input channels should be (See Datasheet)", 5 VIN7 (in) "Analog Inputs. The AD7298 has eight single-ended analog inputs that are multiplexed into the on-chip track-and-hold. Each input channel can accept analog inputs from 0 V to 2.5 V. Any unused input channels should be (See Datasheet)", 6 GND1 (power) "Ground. Ground reference point for the internal reference circuitry on the AD7298. The external reference signals and all analog input signals should be referred to this GND1 voltage. The GND1 pin should be connected to the (See Datasheet)", 7 VREF (io) "Internal Reference/External Reference Supply. The nominal internal reference voltage of 2.5 V appears at this pin. Provided the output is buffered, the on-chip reference can be taken from this pin and applied externally to (See Datasheet)", 8 DCAP "Decoupling Capacitor Pin. Decoupling capacitors (1 uF recommended) are connected to this pin to decouple the internal LDO.", 9 GND (power) "Ground. Ground reference point for all analog and digital circuitry on the AD7298. The GND pin should be connected to the ground plane of the system. All ground pins should ideally be at the same potential and must not be (See Datasheet)", 10 VDD (power) "Supply Voltage, 2.8 V to 3.6 V. This supply should be decoupled to GND with 10 uF and 100 nF decoupling capacitors.", 11 ~{CS} (in) "Chip Select, Active Low Logic Input. This pin is edge triggered on the falling edge of this input, the track-and-hold goes into hold mode, and a conversion is initiated. This input also frames the serial data transfer. When (See Datasheet)", 12 TSENSE_BUSY (out) "Busy Output. This pin transitions high when a temperature sensor conversion starts and remains high until the conversion completes.", 13 DIN (in) "Data In, Logic input. Data to be written to the AD7298 control register is provided on this input and is clocked into the register on the falling edge of SCLK.", 14 DOUT (hiz) "Serial Data Output. The conversion result from the AD7298 is provided on this output as a serial data stream. The bits are clocked out on the falling edge of the SCLK input. The data stream from the AD7298 consists of four (See Datasheet)", 15 SCLK (in) "Serial Clock, Logic Input. A serial clock input provides the SCLK for accessing the data from the AD7298.", 16 VDRIVE (power) "Logic Power Supply Input. The voltage supplied at this pin determines at the voltage at which the interface operates. This pin should be decoupled to GND. The voltage range on this pin is 1.65 V to 3.6 V and may be less than (See Datasheet)", 17 ~{PD}/~{RST} (in) "Power-Down Pin. This pin places the part into full power-down mode and enables power conservation when operation is not required. This pin can be used to reset the device by toggling the pin low for a minimum of 1 ns and a (See Datasheet)", 18 VIN0 (in) "Analog Inputs. The AD7298 has eight single-ended analog inputs that are multiplexed into the on-chip track-and-hold. Each input channel can accept analog inputs from 0 V to 2.5 V. Any unused input channels should be (See Datasheet)", 19 VIN1 (in) "Analog Inputs. The AD7298 has eight single-ended analog inputs that are multiplexed into the on-chip track-and-hold. Each input channel can accept analog inputs from 0 V to 2.5 V. Any unused input channels should be (See Datasheet)", 20 VIN2 (in) "Analog Inputs. The AD7298 has eight single-ended analog inputs that are multiplexed into the on-chip track-and-hold. Each input channel can accept analog inputs from 0 V to 2.5 V. Any unused input channels should be (See Datasheet)", 21 EP (power) "The exposed metal paddle on the bottom of the LFCSP package should be soldered to PCB ground for proper functionality and heat dissipation."